# Altium footprint library pcb.PcbLib: 397 footprints (part 1 of 25)
Each footprint in its own frame and in the unit in brackets; x right, y up, seen from the top. Pads: shape width x height; smd on the part's side, far side on the other; paste and mask are expansions set on the pad; w line width, h text height; cw(c..) or ccw(c..) is an arc to the next point about the centre after c.
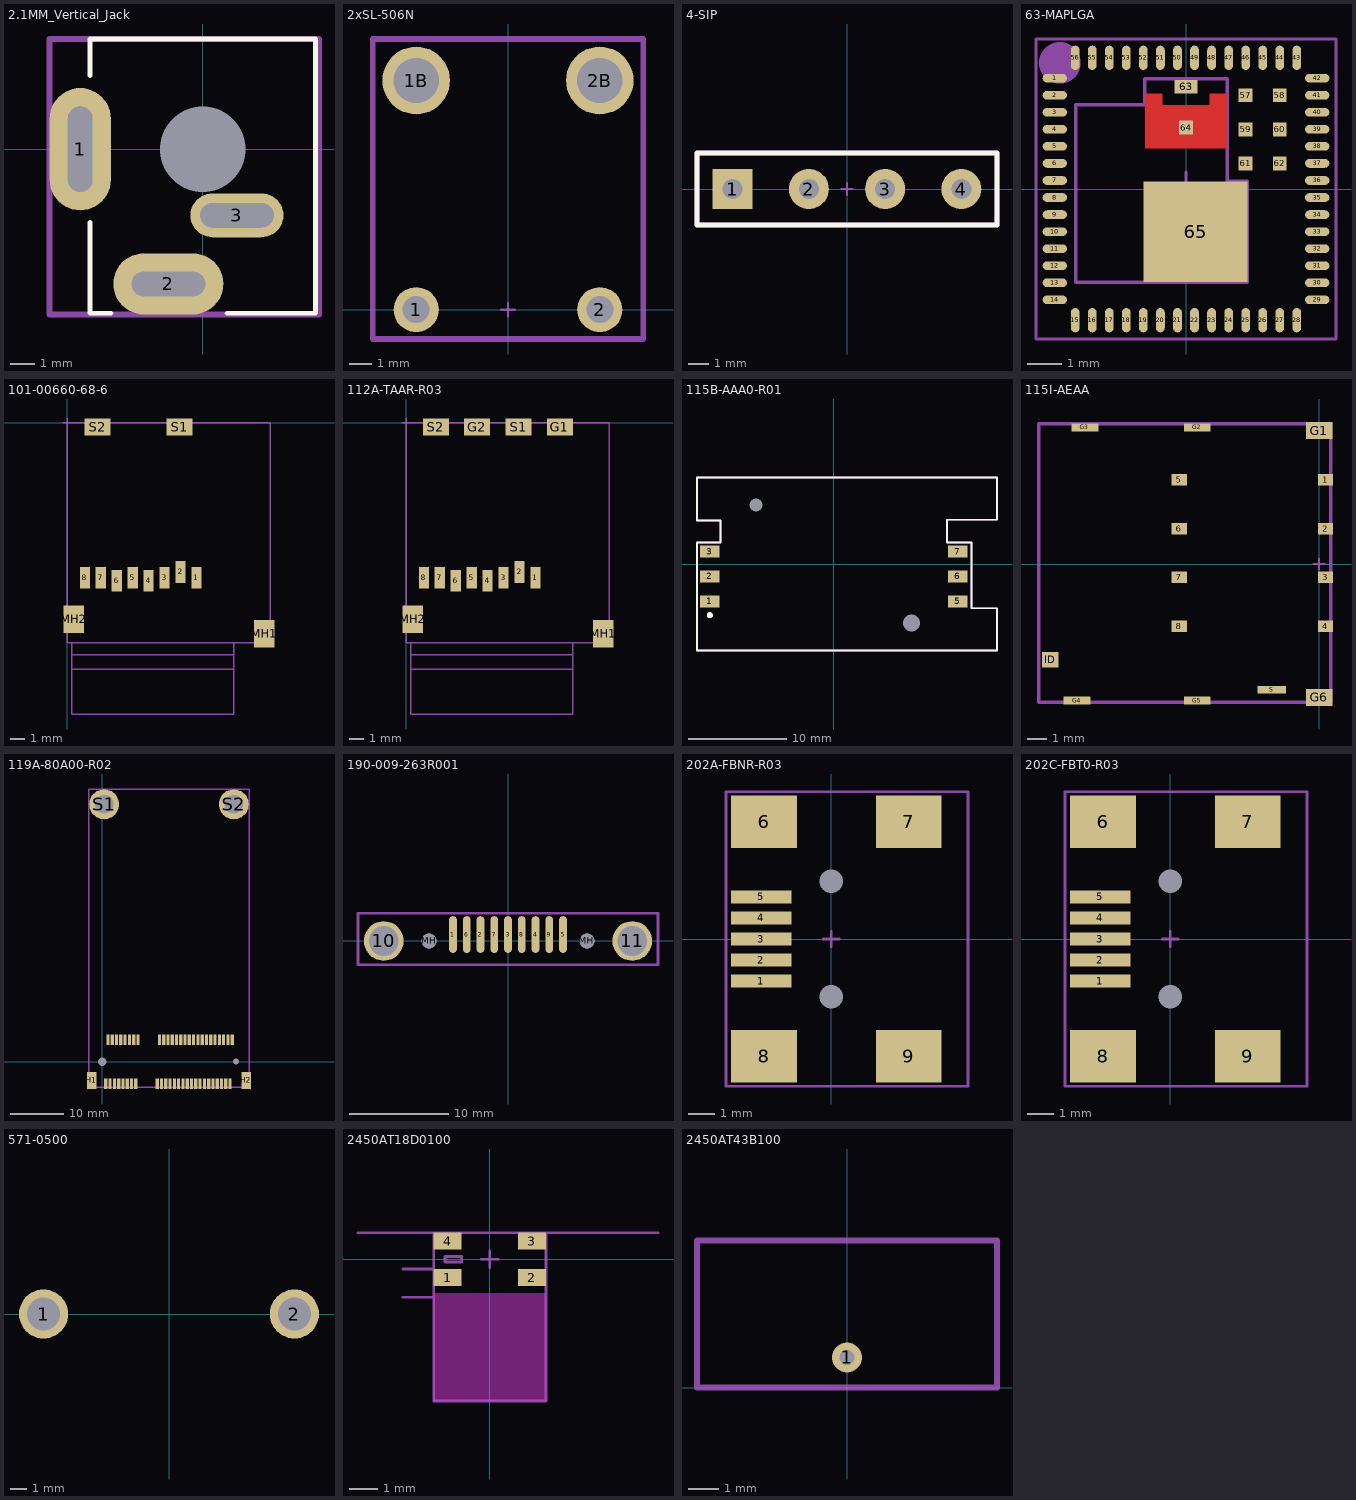
[diagram p0: the footprints below, top view; thin cyan lines are the x and y axes]

## 2.1MM_Vertical_Jack [mm]
height 2.38
pads (4):
  oval 2.5x5 hole 1 slot 3.5 at 90 deg: 1(-5,0)
  oval 4.5x2.5 hole 1 slot 3 at 0 deg: 2(-1.4,-5.5)
  oval 3.8x1.8 hole 1 slot 3 at 0 deg: 3(1.4,-2.7)
  round 0 hole 3.5 unplated paste-1000 mask-1000: ""(0,0)
Top Overlay:
  lines w0.2: -4.6,-3 -4.6,-6.7 -3.75,-6.7 ; -4.6,3 -4.6,4.5 4.6,4.5 4.6,-6.7 1,-6.7
Mechanical 15:
  lines w0.1: -0.3,0 0.3,0 ; 0,-0.3 0,0.3
  lines w0.254: -6.25,-6.75 4.75,-6.75 4.75,4.5 -6.25,4.5 -6.25,-6.75
  text ".Designator" at -2.75,2.75 h1.02
3D body: height 13.6, standoff 0, extent -4.488,-6.6 4.5,4.4

## 2xSL-506N [mm]
pads (4):
  round 2 hole 1.2: 1(-4.07,0) 2(4.07,0)
  round 3 hole 2: 1B(-4.07,10.16) 2B(4.07,10.16)
Mechanical 15:
  lines w0.1: -0.3,0 0.3,0 ; 0,-0.3 0,0.3
  lines w0.254: -6,-1.3 -6,12 6,12 6,-1.3 -6,-1.3
  text ".Designator" at -1.5,1.1 h1.02
3D body "keystone-PN3549.STEP": height 3.33, standoff -3.81, extent -6,-0.032 -2.038,10.432
3D body "keystone-PN3549.STEP": height 3.33, standoff -3.81, extent 2.1,0 6.062,10.465
3D body "minifuse.stp": height 4, standoff 0, extent -5.5,3.35 5.5,19.65

## 4-SIP [mm]
height 12.7
pads (4):
  rect 2x2 hole 1: 1(-5.715,0)
  round 2 hole 1: 2(-1.905,0) 3(1.905,0) 4(5.715,0)
Top Overlay:
  lines w0.254: -7.5,-1.8 7.5,-1.8 7.5,1.8 -7.5,1.8 -7.5,-1.8
Mechanical 15:
  lines w0.1: -0.3,0 0.3,0 ; 0,-0.3 0,0.3
  lines w0.254: -7.5,-1.8 -7.5,1.8 7.5,1.8 7.5,-1.8 -7.5,-1.8
  text ".Designator" at -6.6,-1.3 h1.02
3D body: height 11, standoff 0, extent -7.5,-1.8 7.5,1.8

## 63-MAPLGA [mil]
pads (65):
  oval 28x10 smd mask+2: 1(-151.5,127.95) 2(-151.5,108.27) 3(-151.5,88.58) 4(-151.5,68.9) 5(-151.5,49.21) 6(-151.5,29.53) 7(-151.5,9.84) 8(-151.5,-9.84) 9(-151.5,-29.53) 10(-151.5,-49.21) 11(-151.5,-68.9) 12(-151.5,-88.58) 13(-151.5,-108.27) 14(-151.5,-127.95) 29(151.5,-127.95) 30(151.5,-108.27) 31(151.5,-88.58) 32(151.5,-68.9) 33(151.5,-49.21) 34(151.5,-29.53) 35(151.5,-9.84) 36(151.5,9.84) 37(151.5,29.53) 38(151.5,49.21) 39(151.5,68.9) 40(151.5,88.58) 41(151.5,108.27) 42(151.5,127.95)
  oval 10x28 smd mask+2: 15(-127.95,-151.5) 16(-108.27,-151.5) 17(-88.58,-151.5) 18(-68.9,-151.5) 19(-49.21,-151.5) 20(-29.53,-151.5) 21(-9.84,-151.5) 22(9.84,-151.5) 23(29.53,-151.5) 24(49.21,-151.5) 25(68.9,-151.5) 26(88.58,-151.5) 27(108.27,-151.5) 28(127.95,-151.5) 43(127.95,151.5) 44(108.27,151.5) 45(88.58,151.5) 46(68.9,151.5) 47(49.21,151.5) 48(29.53,151.5) 49(9.84,151.5) 50(-9.84,151.5) 51(-29.53,151.5) 52(-49.21,151.5) 53(-68.9,151.5) 54(-88.58,151.5) 55(-108.27,151.5) 56(-127.95,151.5)
  rect 16x16 smd mask+2: 57(68.9,108.27) 58(108.27,108.27) 59(68.9,68.9) 60(108.27,68.9) 61(68.9,29.53) 62(108.27,29.53)
  rect 26x16 smd mask+2: 63(0,118.11)
  rect 16x16 smd paste-100 mask-100: 64(0,70.87)
  rect 120x116 smd paste-1000 mask+2: 65(11.02,-49.21)
Top Layer:
  region: 47.2,47.24 -47.3,47.24 -47.3,110.24 -27.6,110.24 -27.6,96.54 27.5,96.54 27.5,110.24 47.2,110.24
Top Paste:
  region: 61.81,-98.43 32.28,-98.43 32.28,-70.08 61.81,-70.08
  region: 61.81,-62.2 32.28,-62.2 32.28,-33.86 61.81,-33.86
  region: 61.81,-25.98 32.28,-25.98 32.28,2.36 61.81,2.36
  region: 24.41,-25.98 24.41,2.36 -5.12,2.36 -5.12,-25.98
  region: -12.99,-25.98 -42.52,-25.98 -42.52,2.36 -12.99,2.36
  region: -12.99,-62.2 -42.52,-62.2 -42.52,-33.86 -12.99,-33.86
  region: -12.99,-98.43 -42.52,-98.43 -42.52,-70.08 -12.99,-70.08
  region: 24.41,-98.43 24.41,-70.08 -5.12,-70.08 -5.12,-98.43
  region: 24.41,-62.2 24.41,-33.86 -5.12,-33.86 -5.12,-62.2
  region: -5.91,59.06 -35.43,59.06 -35.43,84.65 -5.91,84.65
  region: 35.43,59.06 5.91,59.06 5.91,84.65 35.43,84.65
Mechanical 15:
  circle w40: c-145.67,145.67 r3.94
  lines w3.94: -19.69,0 19.68,0 ; 0,-19.69 0,19.68 ; -173.23,-173.23 173.23,-173.23 173.23,173.23 -173.23,173.23 -173.23,-173.23 ; -127.5,-107.5 -82.5,-107.5 71,-107.5 71,9 47.5,9 47.5,127.5 -47.5,127.5 -47.5,97.5 -127.5,97.5 -127.5,-107.5
  text ".Designator" at -157.48,-129.92 h40
3D body: height 39.37, standoff 0, extent -157.48,-157.48 157.48,157.48

## 101-00660-68-6 [mm] "FCI microSD connector"
height 1.78
pads (12):
  rect 0.7x1.5 smd: 1(8.92,-10.7) 2(7.82,-10.3) 3(6.72,-10.7) 4(5.62,-10.9) 5(4.52,-10.7) 6(3.42,-10.9) 7(2.32,-10.7) 8(1.22,-10.7)
  rect 1.4x1.9 smd: MH1(13.6,-14.55) MH2(0.45,-13.55)
  rect 1.8x1.2 smd: S1(7.75,-0.3) S2(2.1,-0.3)
Mechanical 15:
  lines w0.1: -0.3,0 0.3,0 ; 0,-0.3 0,0.3 ; 0.3,-17 11.5,-17 ; 0.3,-16 11.5,-16 ; 0.3,-15.2 0.3,-20.1 11.5,-20.1 11.5,-15.2 ; 0,-15.2 14,-15.2 14,0 0,0 0,-15.2
  text ".Designator" at 0.9,-2.7 h1.02
  text "push to insert/eject" at 3.9,-16.6 h0.5
  text "locked" at 3.9,-17.6 h0.5
  text "ejected" at 3.9,-20.7 h0.5
3D body "10100660686-revG.stp": height 1.95, standoff 0.02, extent 0,-15.2 14.05,0
3D body: height 1.4, standoff 0.7, extent 0.3,-20.1 11.5,-5.1
3D body: height 1.45, standoff 0.65, extent 0.3,-17 11.5,-2

## 112A-TAAR-R03 [mm] "ATTEND microSD connector"
height 1.78
pads (14):
  rect 0.7x1.5 smd: 1(8.92,-10.7) 2(7.82,-10.3) 3(6.72,-10.7) 4(5.62,-10.9) 5(4.52,-10.7) 6(3.42,-10.9) 7(2.32,-10.7) 8(1.22,-10.7)
  rect 1.8x1.2 smd: G1(10.6,-0.3) G2(4.9,-0.3) S1(7.75,-0.3) S2(2.05,-0.3)
  rect 1.4x1.9 smd: MH1(13.6,-14.55) MH2(0.45,-13.55)
Mechanical 15:
  lines w0.1: -0.3,0 0.3,0 ; 0,-0.3 0,0.3 ; 0.3,-17 11.5,-17 ; 0.3,-16 11.5,-16 ; 0.3,-15.2 0.3,-20.1 11.5,-20.1 11.5,-15.2 ; 0,-15.2 14,-15.2 14,0 0,0 0,-15.2
  text ".Designator" at 0.9,-2.7 h1.02
  text "push to insert/eject" at 3.9,-16.6 h0.5
  text "locked" at 3.9,-17.6 h0.5
  text "ejected" at 3.9,-20.7 h0.5
3D body "112A-TAAR-R02_C_1.stp": height 1.78, standoff -0.05, extent 0,-15.2 14.005,0
3D body: height 1.4, standoff 0.7, extent 0.3,-20.1 11.5,-5.1
3D body: height 1.45, standoff 0.65, extent 0.3,-17 11.5,-2

## 115B-AAA0-R01 [mm]
height 2.3
pads (8):
  rect 2x1.2 smd: 1(-12.6,-3.81) 2(-12.6,-1.27) 3(-12.6,1.27) 5(12.6,-3.81) 6(12.6,-1.27) 7(12.6,1.27)
  rect 0x0 hole 1.3 unplated: H1(-7.9,6)
  rect 0x0 hole 1.75 unplated: H2(7.9,-6)
Top Overlay:
  circle w0.406: c-12.6,-5.2 r0.1
  lines w0.2: -13.9,-8.8 -13.9,2.2 -11.5,2.2 -11.5,4.4 -13.9,4.4 -13.9,8.8 16.6,8.8 16.6,4.5 11.5,4.5 11.5,2.2 14,2.2 14,-4.5 16.6,-4.5 16.6,-8.8 -13.9,-8.8
Mechanical 15:
  circle w0.406: c-12.6,-5.2 r0.1
  lines w0.1: -12.9,-3.81 -12.3,-3.81 ; -12.6,-4.11 -12.6,-3.51
  lines w0.2: -13.9,-8.8 -13.9,2.2 -11.5,2.2 -11.5,4.4 -13.9,4.4 -13.9,8.8 16.6,8.8 16.6,4.5 11.5,4.5 11.5,2.2 14,2.2 14,-4.5 16.6,-4.5 16.6,-8.8 -13.9,-8.8
  text ".Designator" at -3.4,-0.3 h1.02
3D body "115B-AAA0-R01_C_1.stp": height 2.35, standoff -0.7, extent -13.3,-8.6 16.4,8.6

## 115I-AEAA [mm]
height 2.3
pads (16):
  rect 0.8x0.6 smd: 1(0.33,4.38) 2(0.33,1.84) 3(0.33,-0.7) 4(0.33,-3.24) 5(-7.29,4.38) 6(-7.29,1.84) 7(-7.29,-0.7) 8(-7.29,-3.24)
  rect 1.4x0.87 smd: G1(0,6.95) G6(0,-6.95)
  rect 1.4x0.43 smd: G2(-6.35,7.11) G3(-12.2,7.11) G4(-12.61,-7.11) G5(-6.35,-7.11)
  rect 0.85x0.8 smd: ID(-14,-4.98)
  rect 1.5x0.4 smd: S(-2.47,-6.54)
Mechanical 15:
  lines w0.1: -0.3,0 0.3,0 ; 0,-0.3 0,0.3
  lines w0.2: -14.6,-7.2 0.6,-7.2 0.6,7.3 -14.6,7.3 -14.6,-7.2
  text ".Designator" at -0.8,-0.5 h1.02
  text "insert" at 2,-2.8 h1.02
3D body "115I-AEAA_C_1.stp": height 1.4, standoff 0, extent -14.61,-7.185 0.61,7.3

## 119A-80A00-R02 [mm]
height 8
pads (58):
  rect 0.6x2 smd: 1(0.7,-4.1) 2(1.1,4.1) 3(1.5,-4.1) 4(1.9,4.1) 5(2.3,-4.1) 6(2.7,4.1) 7(3.1,-4.1) 8(3.5,4.1) 9(3.9,-4.1) 10(4.3,4.1) 11(4.7,-4.1) 12(5.1,4.1) 13(5.5,-4.1) 14(5.9,4.1) 15(6.3,-4.1) 16(6.7,4.1) 17(10.3,-4.1) 18(10.7,4.1) 19(11.1,-4.1) 20(11.5,4.1) 21(11.9,-4.1) 22(12.3,4.1) 23(12.7,-4.1) 24(13.1,4.1) 25(13.5,-4.1) 26(13.9,4.1) 27(14.3,-4.1) 28(14.7,4.1) 29(15.1,-4.1) 30(15.5,4.1) 31(15.9,-4.1) 32(16.3,4.1) 33(16.7,-4.1) 34(17.1,4.1) 35(17.5,-4.1) 36(17.9,4.1) 37(18.3,-4.1) 38(18.7,4.1) 39(19.1,-4.1) 40(19.5,4.1) 41(19.9,-4.1) 42(20.3,4.1) 43(20.7,-4.1) 44(21.1,4.1) 45(21.5,-4.1) 46(21.9,4.1) 47(22.3,-4.1) 48(22.7,4.1) 49(23.1,-4.1) 50(23.5,4.1) 51(23.9,-4.1) 52(24.3,4.1)
  rect 1.8x3.2 smd: H1(-1.9,-3.5) H2(26.9,-3.5)
  round 5.6 / inner round 0 / far side round 0 hole 3.4: S1(0.4,48.05) S2(24.6,48.05)
  round 0 hole 1.6 unplated: ""(0,0)
  round 0 hole 1.1 unplated: ""(25,0)
Top Paste:
  circle w0.7: c0.4,48.05 r2.25
  circle w0.7: c24.6,48.05 r2.25
Mechanical 15:
  lines w0.1: -0.3,0 0.3,0 ; 0,-0.3 0,0.3
  lines w0.254: -2.5,-4.8 -2.5,50.9 27.5,50.9 27.5,-4.8 -2.5,-4.8
  text ".Designator" at -0.1,-2 h1.02
3D body: height 5.6, standoff 0, extent -1.85,45.8 2.632,50.291
3D body "minicard.stp": height 8.95, standoff 4.2, extent -2.5,0 27.5,50.95
3D body "119A-80A00-R02_C_1.stp": height 7.92, standoff -0.75, extent -2.5,-4.8 27.507,4.7
3D body: height 0, standoff -1.1, extent -1.2,46.45 1.987,49.644
3D body: height 0, standoff -1.1, extent 23,46.45 26.187,49.644
3D body: height 5.6, standoff 0, extent 22.35,45.8 26.832,50.291

## 190-009-263R001 [mm]
height 12.55
pads (13):
  oval 0.8x3.7 smd: 1(-5.54,0.65) 2(-2.77,0.65) 3(0,0.65) 4(2.77,0.65) 5(5.54,0.65) 6(-4.155,0.65) 7(-1.385,0.65) 8(1.385,0.65) 9(4.155,0.65)
  round 4 hole 3: 10(-12.5,0) 11(12.5,0)
  round 1.5 hole 1.5: MH(-7.95,0) MH(7.95,0)
Mechanical 15:
  lines w0.254: -15.1,-2.4 15.1,-2.4 15.1,2.8 -15.1,2.8 -15.1,-2.4
  text ".Designator" at -0.1,-1.8 h1.02
  text "pcb_edge" at -3.8,3.2 h1.02
3D body "190-009-263.STEP": height 10.77, standoff -3.63, extent -15.049,-0.617 15.05,10

## 202A-FBNR-R03 [mm] "Connector; USB2.0, Type B, SM; 5 Position; Right Angle"
height 3.9
pads (11):
  rect 2.3x0.5 smd: 1(-2.65,-1.6) 2(-2.65,-0.8) 3(-2.65,0) 4(-2.65,0.8) 5(-2.65,1.6)
  rect 2.5x2 smd: 6(-2.55,4.45) 7(2.95,4.45) 8(-2.55,-4.45) 9(2.95,-4.45)
  round 0 hole 0.9 unplated: MH1(0,2.2) MH2(0,-2.2)
Mechanical 15:
  lines w0.1: -0.3,0 0.3,0 ; 0,-0.3 0,0.3 ; -4,-5.6 5.2,-5.6 5.2,5.6 -4,5.6 -4,-5.6
  text ".Designator" at 1.3,4.8 h1.02
  text "pcb_edge" at 6.3,-4.5 h1.02
3D body "202A-FXNR-R03.stp": height 3.9, standoff -0.6, extent -3.55,-4.95 5.85,4.978

## 202C-FBT0-R03 [mm] "Connector; USB2.0, Type AB, SM; 5 Position; Right Angle"
height 3.9
pads (11):
  rect 2.3x0.5 smd: 1(-2.65,-1.6) 2(-2.65,-0.8) 3(-2.65,0) 4(-2.65,0.8) 5(-2.65,1.6)
  rect 2.5x2 smd: 6(-2.55,4.45) 7(2.95,4.45) 8(-2.55,-4.45) 9(2.95,-4.45)
  round 0 hole 0.9 unplated: MH1(0,2.2) MH2(0,-2.2)
Mechanical 15:
  lines w0.1: -0.3,0 0.3,0 ; 0,-0.3 0,0.3 ; -4,-5.6 5.2,-5.6 5.2,5.6 -4,5.6 -4,-5.6
  text ".Designator" at 1.3,4.8 h1.02
  text "pcb_edge" at 6.3,-4.5 h1.02
3D body "202F-FGT0-R_C_1.stp": height 3.99, standoff -0.81, extent -3.3,-4.9 5.9,4.9

## 571-0500 [mm] "Test Sockets SINGLE PCB SOCK RED"
pads (2):
  round 3 hole 2: 1(-7.65,0) 2(7.65,0)
3D body "User Library-Multicomp_24_243_2.STEP": height 13, standoff -6, extent -11.3,-5.1 12.7,5.6

## 2450AT18D0100 [mm]
height 1.4
pads (4):
  rect 1x0.6 smd: 1(-1.5,-0.65) 2(1.5,-0.65) 3(1.5,0.65) 4(-1.5,0.65)
Top Layer keep-out:
  rectangle: -2,-5.05 2,-1.2
Mechanical 15:
  lines w0.1: -4.7,0.95 -2,0.95 ; -3.1,-1.35 -2,-1.35 ; -3.1,-0.35 -2,-0.35 ; -0.3,0 0.3,0 ; 0,-0.3 0,0.3 ; 6,0.95 2,0.95 ; -2,0.95 -2,-5.05 2,-5.05 2,0.95 ; -2,0.95 2,0.95 ; -1.6,-0.1 -1.6,0.1 -1,0.1 -1,-0.1 -1.6,-0.1
  text ".Designator" at -1.7,-1.2 h0.8
  text "pcb_edge" at 2.6,1.15 h0.5
  text "keepout" at -0.9,-4.3 h0.5
  text "feed" at -4.3,-1.1 h0.5
3D body: height 1.4, standoff 0, extent -1.7,-0.9 1.7,0.9

## 2450AT43B100 [mm]
pads (1):
  round 1 hole 0.5: 1(0,1)
Mechanical 15:
  lines w0.2: -5,0 5,0 5,4.9 -5,4.9 -5,0
3D body: height 1, standoff 0, extent -3.5,2.5 3.5,4.5

## 7798 [mm] "Keystone Elctronics 7798 term screw"